# Altium footprint library Connectors.PcbLib: 120 footprints (part 8 of 8)
Each footprint in its own frame and in the unit in brackets; x right, y up, seen from the top. Pads: shape width x height; smd on the part's side, far side on the other; paste and mask are expansions set on the pad; w line width, h text height; cw(c..) or ccw(c..) is an arc to the next point about the centre after c.
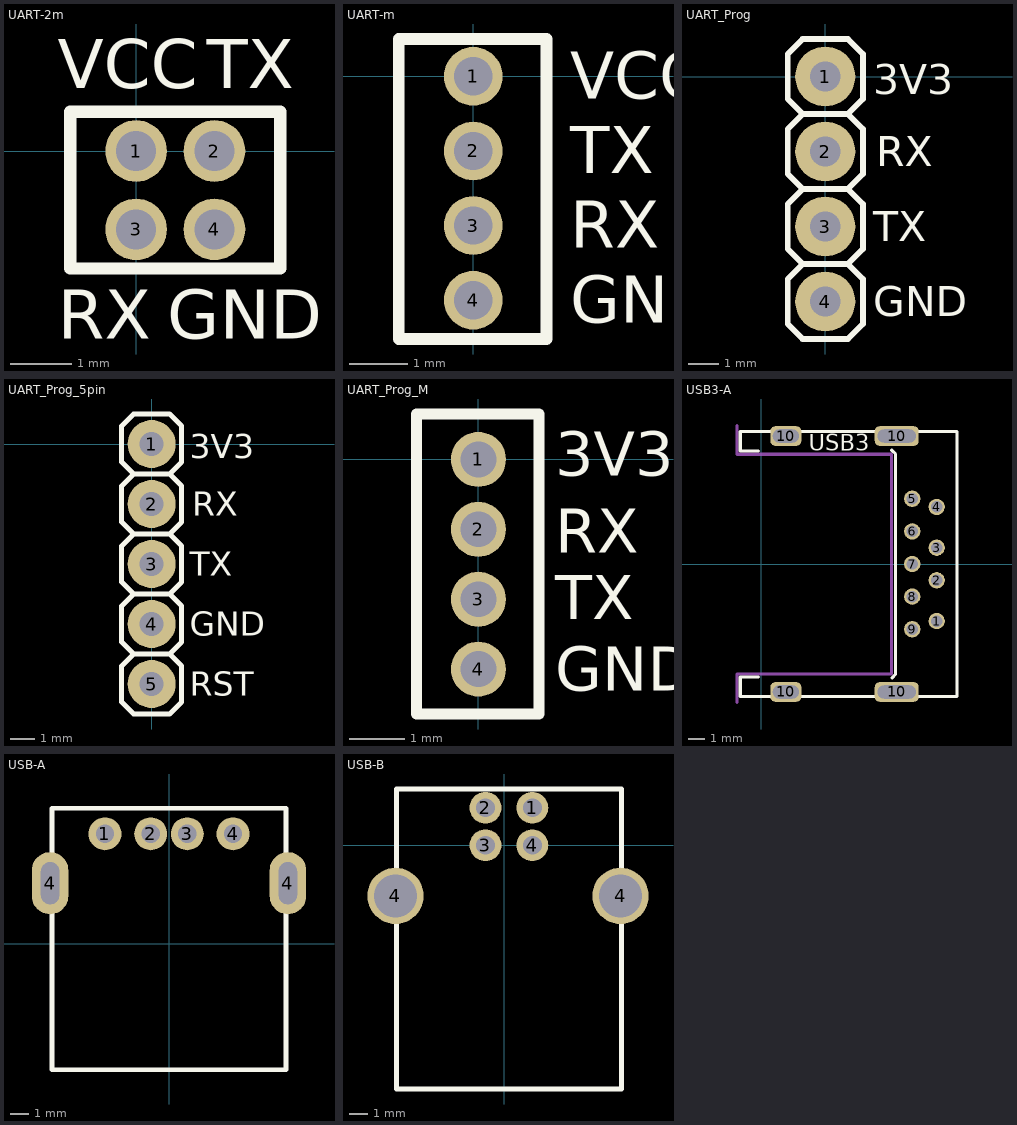
[diagram p7: the footprints below, top view; thin cyan lines are the x and y axes]

## UART-2m [mm]
pads (4):
  round 1 hole 0.65: 1(0,0) 2(1.27,0) 3(0,-1.27) 4(1.27,-1.27)
Top Overlay:
  lines w0.2: -1.067,-1.905 2.337,-1.905 2.337,0.635 -1.067,0.635 -1.067,-1.905
  text "VCC" at -1.27,1.016 h0.8
  text "TX" at 1.143,1.016 h0.8
  text "RX" at -1.27,-3.048 h0.8
  text "GND" at 0.508,-3.048 h0.8
3D body "PLL-2.stp": height 5.2, standoff -2.9, extent -1.1,-2.1 1.1,0.85
3D body "PLL-2.stp": height 5.2, standoff -2.9, extent 0.17,-2.1 2.37,0.85

## UART-m [mm]
pads (4):
  round 1 hole 0.65: 1(0,0) 2(0,-1.27) 3(0,-2.54) 4(0,-3.81)
Top Overlay:
  lines w0.2: -1.27,-4.47 1.245,-4.47 1.245,0.635 -1.27,0.635 -1.27,-4.47
  text "VCC" at 1.651,-0.381 h0.8
  text "TX" at 1.651,-1.651 h0.8
  text "RX" at 1.651,-2.921 h0.8
  text "GND" at 1.651,-4.191 h0.8
3D body "PLL-2.stp": height 5.2, standoff -2.9, extent -1.1,-2.1 1.1,0.85
3D body "PLL-2.stp": height 5.2, standoff -2.9, extent -1.1,-4.64 1.1,-1.69

## UART_Prog [mm] "UART_Prog"
pads (4):
  round 2 hole 1: 1(0,0) 2(0,-2.5) 3(0,-5) 4(0,-7.5)
Top Overlay:
  lines w0.2: -0.75,-6.25 0.75,-6.25 ; -0.75,-6.25 -1.25,-5.75 -1.25,-4.25 -0.75,-3.75 ; -0.75,-6.25 -1.25,-6.75 -1.25,-8.25 -0.75,-8.75 0.75,-8.75 1.25,-8.25 1.25,-6.75 0.75,-6.25 ; -0.75,-3.75 -1.25,-3.25 -1.25,-1.75 -0.75,-1.25 ; -0.75,-3.75 0.75,-3.75 ; -0.75,-1.25 0.75,-1.25 ; -0.75,-1.25 -1.25,-0.75 -1.25,0.75 -0.75,1.25 0.75,1.25 1.25,0.75 1.25,-0.75 0.75,-1.25 ; 0.75,-6.25 1.25,-5.75 1.25,-4.25 0.75,-3.75 ; 0.75,-3.75 1.25,-3.25 1.25,-1.75 0.75,-1.25
  text "3V3" at 1.6,-0.6 h1
  text "RX" at 1.7,-3 h1
  text "TX" at 1.6,-5.5 h1
  text "GND" at 1.6,-8 h1
3D body "User Library-PLS-1.STEP": height 8.44, standoff -3, extent -1.27,-8.85 1.27,-6.31
3D body "User Library-PLS-1.STEP": height 8.44, standoff -3, extent -1.27,-1.27 1.27,1.27
3D body "User Library-PLS-1.STEP": height 8.44, standoff -3, extent -1.27,-3.81 1.27,-1.27
3D body "User Library-PLS-1.STEP": height 8.44, standoff -3, extent -1.27,-6.35 1.27,-3.81

## UART_Prog_5pin [mm]
pads (5):
  round 2 hole 1: 1(0,0) 2(0,-2.5) 3(0,-5) 4(0,-7.5) 5(0,-10)
Top Overlay:
  lines w0.2: -0.75,-8.75 -1.25,-9.25 -1.25,-10.75 -0.75,-11.25 0.75,-11.25 1.25,-10.75 1.25,-9.25 0.75,-8.75 ; -0.75,-8.75 -1.25,-8.25 -1.25,-6.75 -0.75,-6.25 ; -0.75,-8.75 0.75,-8.75 ; -0.75,-6.25 0.75,-6.25 ; -0.75,-6.25 -1.25,-5.75 -1.25,-4.25 -0.75,-3.75 ; -0.75,-3.75 -1.25,-3.25 -1.25,-1.75 -0.75,-1.25 ; -0.75,-3.75 0.75,-3.75 ; -0.75,-1.25 0.75,-1.25 ; -0.75,-1.25 -1.25,-0.75 -1.25,0.75 -0.75,1.25 0.75,1.25 1.25,0.75 1.25,-0.75 0.75,-1.25 ; 0.75,-8.75 1.25,-8.25 1.25,-6.75 0.75,-6.25 ; 0.75,-6.25 1.25,-5.75 1.25,-4.25 0.75,-3.75 ; 0.75,-3.75 1.25,-3.25 1.25,-1.75 0.75,-1.25
  text "3V3" at 1.6,-0.6 h1
  text "RX" at 1.7,-3 h1
  text "TX" at 1.6,-5.5 h1
  text "GND" at 1.6,-8 h1
  text "RST" at 1.6,-10.5 h1
3D body "User Library-PLS-1.STEP": height 8.44, standoff -3, extent -1.27,-8.85 1.27,-6.31
3D body "User Library-PLS-1.STEP": height 8.44, standoff -3, extent -1.27,-1.27 1.27,1.27
3D body "User Library-PLS-1.STEP": height 8.44, standoff -3, extent -1.27,-3.81 1.27,-1.27
3D body "User Library-PLS-1.STEP": height 8.44, standoff -3, extent -1.27,-6.35 1.27,-3.81
3D body "User Library-PLS-1.STEP": height 8.44, standoff -3, extent -1.27,-11.35 1.27,-8.81

## UART_Prog_M [mm]
pads (4):
  round 1 hole 0.65: 1(0,0) 2(0,-1.27) 3(0,-2.54) 4(0,-3.81)
Top Overlay:
  lines w0.2: -1.125,-4.625 1.1,-4.625 1.1,0.825 -1.125,0.825 -1.125,-4.625
  text "GND" at 1.4,-4.2 h0.8
  text "TX" at 1.4,-2.9 h0.8
  text "RX" at 1.4,-1.7 h0.8
  text "3V3" at 1.4,-0.3 h0.8
3D body "PLL-2.stp": height 5.2, standoff -2.9, extent -1.1,-2.1 1.1,0.85
3D body "PLL-2.stp": height 5.2, standoff -2.9, extent -1.1,-4.64 1.1,-1.69

## USB3-A [mm] "USB 3.0 Type A connector"
pads (13):
  round 1 hole 0.7: 1(10.75,-3.5) 2(10.75,-1) 3(10.75,1) 4(10.75,3.5) 5(9.25,4) 6(9.25,2) 7(9.25,0) 8(9.25,-2) 9(9.25,-4)
  rrect50% 1.9x1.2 hole 0.8 slot 1.6 at 0 deg: 10(1.5,-7.85) 10(1.5,7.85)
  rrect50% 2.7x1.2 hole 0.8 slot 2.35 at 0 deg: 10(8.3,-7.85) 10(8.3,7.85)
Top Overlay:
  lines w0.2: -0.2,6.925 -1.3,6.925 -1.3,8.125 12,8.125 12,-8.125 -1.3,-8.125 -1.3,-6.925 -0.175,-6.925 ; 8,6.975 8.225,6.75 8.225,6.725 8.225,-6.75 8.225,-6.775 8.025,-6.975
  text "USB3" at 2.9,6.95 h1
Mechanical 1:
  lines w0.2: -1.5,-8.5 -1.5,-6.75 7.975,-6.75 7.975,0 7.975,6.725 -1.5,6.725 -1.5,8.5
3D body "c-1932847-1-a-3d.stp": height 5.63, standoff -1.63, extent -3.85,-8 12.02,8

## USB-A [mm]
pads (6):
  round 1.8 hole 1: 1(-3.5,6) 2(-1,6) 3(1,6) 4(3.5,6)
  oval 2x3.4 hole 1 slot 2.3 at 90 deg: 4(-6.5,3.3) 4(6.5,3.3)
Top Overlay:
  lines w0.254: -6.4,-6.9 -6.4,7.4 6.4,7.4 6.4,-6.9 -6.4,-6.9
3D body "SW3dPS-USB-A-01.STEP": height 6.95, standoff -4.2, extent -8.025,-6.475 7.775,7.225

## USB-B [mm]
pads (6):
  round 1.7 hole 1: 1(1.5,2) 2(-1,2) 3(-1,0) 4(1.5,0)
  round 3 hole 2.3: 4(-5.8,-2.7) 4(6.2,-2.7)
Top Overlay:
  lines w0.254: -5.75,-13 6.25,-13 6.25,3 -5.75,3 -5.75,-13
3D body "User Library-Samtec - USB-B-S-X-W-TH.STEP": height 11, standoff -3.64, extent -7.225,-13.15 7.573,3.35